# Altium footprint library discret_ic.pcblib: 55 footprints (part 2 of 4)
Each footprint in its own frame and in the unit in brackets; x right, y up, seen from the top. Pads: shape width x height; smd on the part's side, far side on the other; paste and mask are expansions set on the pad; w line width, h text height; cw(c..) or ccw(c..) is an arc to the next point about the centre after c.
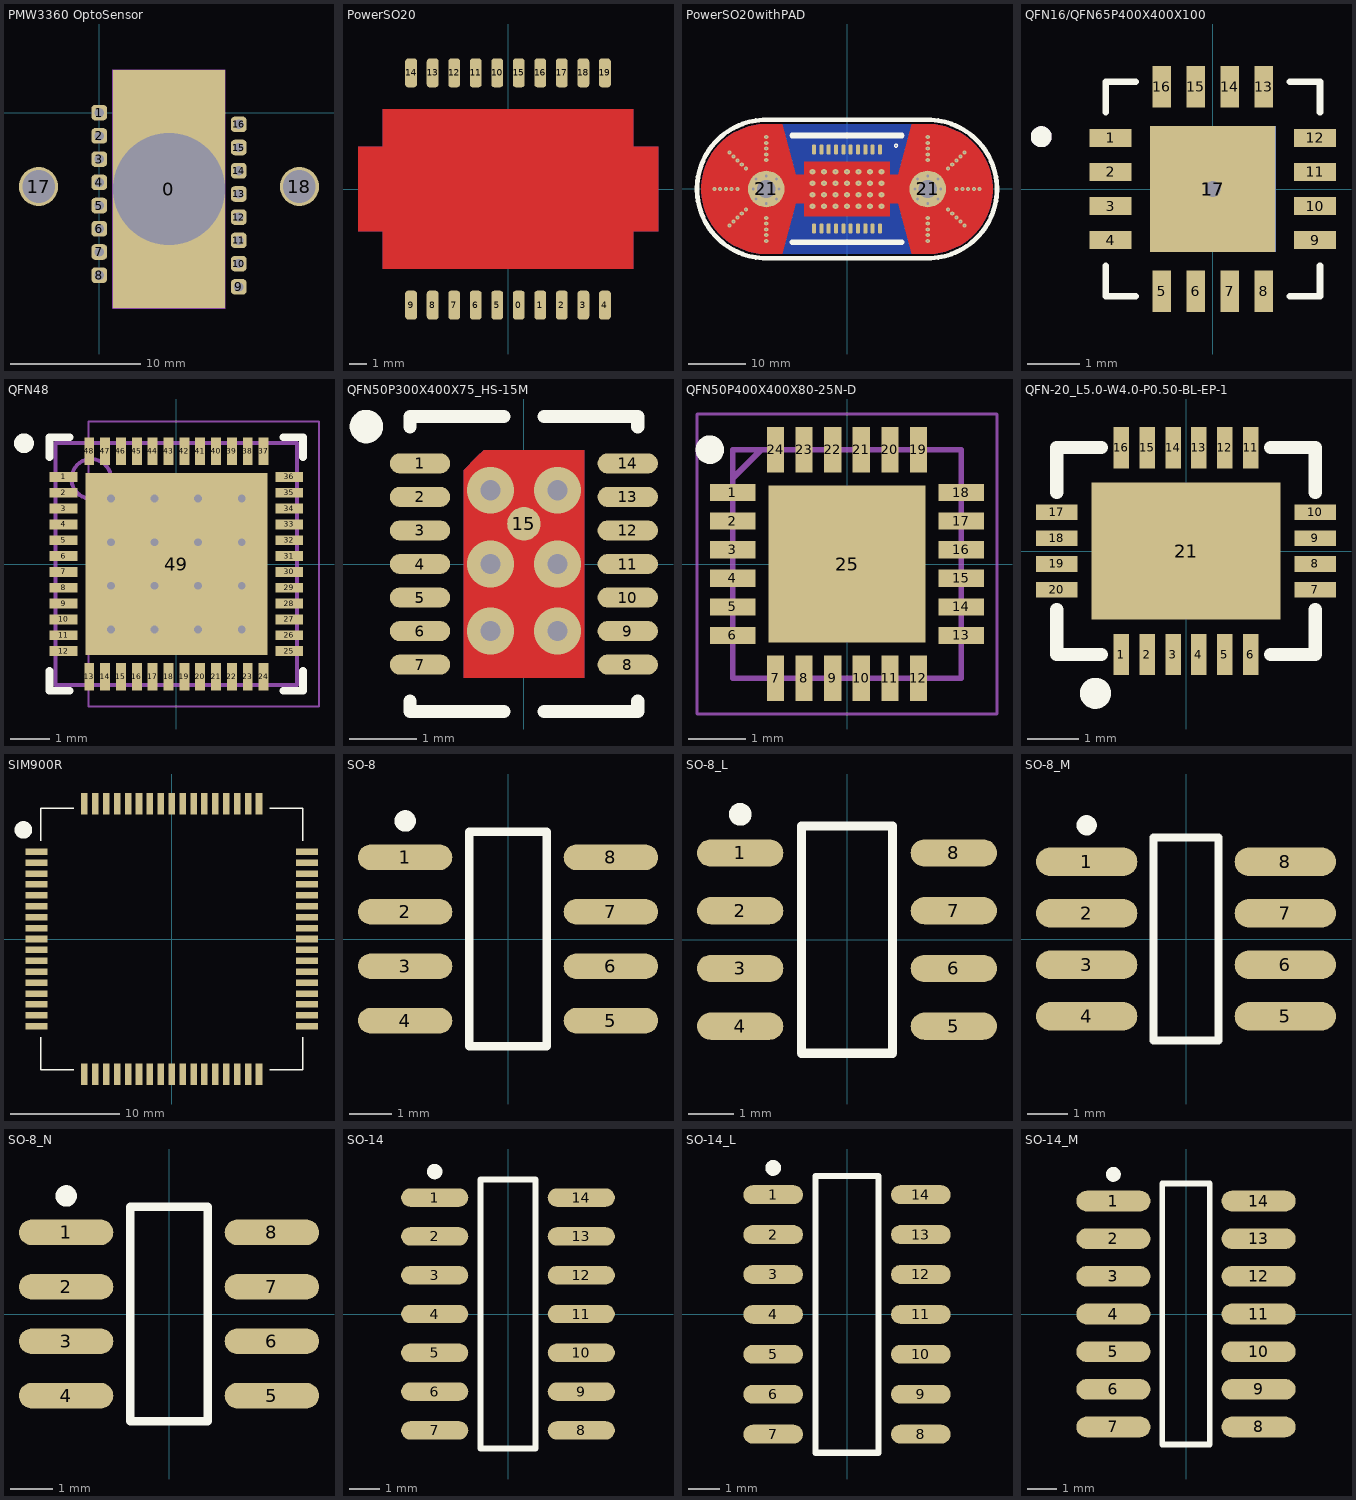
[diagram p1: the footprints below, top view; thin cyan lines are the x and y axes]

## PMW3360 OptoSensor [mm]
pads (19):
  rect 8.6x18.26 hole 8.6 square unplated: 0(5.35,-5.85)
  rrect50% 1.2x1.2 hole 0.7: 1(0,0) 2(0,-1.78) 3(0,-3.56) 4(0,-5.34) 5(0,-7.12) 6(0,-8.9) 7(0,-10.68) 8(0,-12.46) 9(10.7,-13.35) 10(10.7,-11.57) 11(10.7,-9.79) 12(10.7,-8.01) 13(10.7,-6.23) 14(10.7,-4.45) 15(10.7,-2.67) 16(10.7,-0.89)
  round 3 hole 2.5: 17(-4.65,-5.66) 18(15.35,-5.66)
Bottom Overlay:
  lines w0.5: 0.385,2.34 -2.65,2.34 -2.65,-5.66 -2.65,-13.66 0.46,-13.66 ; 10.29,2.34 13.35,2.34 13.35,-5.66 13.35,-13.66 11.91,-13.66
Board:
  lines w0.05: 1.05,-14.98 1.05,0 1.05,3.28 9.65,3.28 9.65,-14.98 1.05,-14.98
Bot3D:
  lines w0.254: 5.425,0 5.5,0.075

## PowerSO20 [mm]
pads (20):
  rrect50% 0.7x1.7 smd: 0(0.635,-6.85) 1(1.905,-6.85) 2(3.175,-6.85) 3(4.445,-6.85) 4(5.715,-6.85) 5(-0.635,-6.85) 6(-1.905,-6.85) 7(-3.175,-6.85) 8(-4.445,-6.85) 9(-5.715,-6.85) 10(-0.635,6.85) 11(-1.905,6.85) 12(-3.175,6.85) 13(-4.445,6.85) 14(-5.715,6.85) 15(0.635,6.85) 16(1.905,6.85) 17(3.175,6.85) 18(4.445,6.85) 19(5.715,6.85)
Top Layer:
  region: -8.85,2.5 -7.4,2.5 -7.4,4.7 7.4,4.7 7.4,2.5 8.85,2.5 8.85,-2.5 7.4,-2.5 7.4,-4.7 -7.4,-4.7 -7.4,-2.5 -8.85,-2.5
Bottom Layer:
  region: -8.85,2.5 -7.4,2.5 -7.4,4.7 7.4,4.7 7.4,2.5 8.85,2.5 8.85,-2.5 7.4,-2.5 7.4,-4.7 -7.4,-4.7 -7.4,-2.5 -8.85,-2.5
3D body "User Library-PowerSO20.STEP": height 3.6, standoff 0, extent -7.985,-7.25 8.015,7.15

## PowerSO20withPAD [mm]
pads (22):
  rrect50% 0.7x1.7 smd: 1(5.715,6.85) 2(4.445,6.85) 3(3.175,6.85) 4(1.905,6.85) 5(0.635,6.85) 6(-0.635,6.85) 7(-1.905,6.85) 8(-3.175,6.85) 9(-4.445,6.85) 10(-5.715,6.85) 11(-5.715,-6.85) 12(-4.445,-6.85) 13(-3.175,-6.85) 14(-1.905,-6.85) 15(-0.635,-6.85) 16(0.635,-6.85) 17(1.905,-6.85) 18(3.175,-6.85) 19(4.445,-6.85) 20(5.715,-6.85)
  round 6.35 hole 3.175: 21(-14,0) 21(14,0)
via -6,-3 diameter 1 hole 0.3
via -6,-1 diameter 1 hole 0.3
via -6,1 diameter 1 hole 0.3
via -4,-3 diameter 1 hole 0.3
via -4,-1 diameter 1 hole 0.3
via -4,1 diameter 1 hole 0.3
via -2,-3 diameter 1 hole 0.3
via -2,-1 diameter 1 hole 0.3
via -2,1 diameter 1 hole 0.3
via 0,1 diameter 1 hole 0.3
via 0,-1 diameter 1 hole 0.3
via 0,-3 diameter 1 hole 0.3
via 2,-3 diameter 1 hole 0.3
via 2,-1 diameter 1 hole 0.3
via 2,1 diameter 1 hole 0.3
via 4,1 diameter 1 hole 0.3
via 4,-1 diameter 1 hole 0.3
via 4,-3 diameter 1 hole 0.3
via 6,-3 diameter 1 hole 0.3
via 6,-1 diameter 1 hole 0.3
via 6,1 diameter 1 hole 0.3
via 6,3 diameter 1 hole 0.3
via 4,3 diameter 1 hole 0.3
via 2,3 diameter 1 hole 0.3
via 0,3 diameter 1 hole 0.3
via -2,3 diameter 1 hole 0.3
via -4,3 diameter 1 hole 0.3
via -6,3 diameter 1 hole 0.3
via -12.25,-1.75 diameter 0.889 hole 0.508
via -15.75,-1.75 diameter 0.889 hole 0.508
via -15.75,1.75 diameter 0.889 hole 0.508
via -12.25,1.75 diameter 0.889 hole 0.508
via -14,-2.5 diameter 0.889 hole 0.508
via -14,2.25 diameter 0.889 hole 0.508
via -11.75,0 diameter 0.889 hole 0.508
via -16.25,0 diameter 0.889 hole 0.508
via 15.75,-1.75 diameter 0.889 hole 0.508
via 12.25,-1.75 diameter 0.889 hole 0.508
via 12.25,1.75 diameter 0.889 hole 0.508
via 15.75,1.75 diameter 0.889 hole 0.508
via 14,-2.5 diameter 0.889 hole 0.508
via 14,2.25 diameter 0.889 hole 0.508
via 16.25,0 diameter 0.889 hole 0.508
via 11.75,0 diameter 0.889 hole 0.508
via -14,-5 diameter 0.7 hole 0.3
via -14,-6 diameter 0.7 hole 0.3
via -14,-7 diameter 0.7 hole 0.3
via -14,-8 diameter 0.7 hole 0.3
via -14,-9 diameter 0.7 hole 0.3
via -14,9 diameter 0.7 hole 0.3
via -14,8 diameter 0.7 hole 0.3
via -14,7 diameter 0.7 hole 0.3
via -14,6 diameter 0.7 hole 0.3
via -14,5 diameter 0.7 hole 0.3
via -20.364,6.364 diameter 0.7 hole 0.3
via -19.657,5.657 diameter 0.7 hole 0.3
via -18.95,4.95 diameter 0.7 hole 0.3
via -18.243,4.243 diameter 0.7 hole 0.3
via -17.536,3.536 diameter 0.7 hole 0.3
via -23,0 diameter 0.7 hole 0.3
via -22,0 diameter 0.7 hole 0.3
via -21,0 diameter 0.7 hole 0.3
via -20,0 diameter 0.7 hole 0.3
via -19,0 diameter 0.7 hole 0.3
via -20.364,-6.364 diameter 0.7 hole 0.3
via -19.657,-5.657 diameter 0.7 hole 0.3
via -18.95,-4.95 diameter 0.7 hole 0.3
via -18.243,-4.243 diameter 0.7 hole 0.3
via -17.536,-3.536 diameter 0.7 hole 0.3
via 14,-9 diameter 0.7 hole 0.3
via 14,-8 diameter 0.7 hole 0.3
via 14,-7 diameter 0.7 hole 0.3
via 14,-6 diameter 0.7 hole 0.3
via 14,-5 diameter 0.7 hole 0.3
via 20.364,-6.364 diameter 0.7 hole 0.3
via 19.657,-5.657 diameter 0.7 hole 0.3
via 18.95,-4.95 diameter 0.7 hole 0.3
via 18.243,-4.243 diameter 0.7 hole 0.3
via 17.536,-3.536 diameter 0.7 hole 0.3
via 23,0 diameter 0.7 hole 0.3
via 22,0 diameter 0.7 hole 0.3
via 21,0 diameter 0.7 hole 0.3
via 20,0 diameter 0.7 hole 0.3
via 19,0 diameter 0.7 hole 0.3
via 20.364,6.364 diameter 0.7 hole 0.3
via 19.657,5.657 diameter 0.7 hole 0.3
via 18.95,4.95 diameter 0.7 hole 0.3
via 18.243,4.243 diameter 0.7 hole 0.3
via 17.536,3.536 diameter 0.7 hole 0.3
via 14,9 diameter 0.7 hole 0.3
via 14,8 diameter 0.7 hole 0.3
via 14,7 diameter 0.7 hole 0.3
via 14,6 diameter 0.7 hole 0.3
via 14,5 diameter 0.7 hole 0.3
Top Layer:
  region: -8.85,2.5 -11.25,11.25 -11.25,-11.25 -8.85,-2.5
  region: -14,-11.25 -14,11.25 -14.442,11.25 -15.323,11.181 -16.196,11.042 -17.056,10.836 -17.897,10.563 -18.714,10.224 -19.501,9.823 -20.255,9.361 -20.97,8.842 -21.642,8.268 -22.268,7.642 -22.842,6.97 -23.361,6.255 -23.823,5.501 -24.224,4.714 -24.563,3.897 -24.836,3.056 -25.042,2.196 -25.181,1.323 -25.25,0.442 -25.25,0 -25.25,-0.442 -25.181,-1.323 -25.042,-2.196 -24.836,-3.056 -24.563,-3.897 -24.224,-4.714 -23.823,-5.501 -23.361,-6.255 -22.842,-6.97 -22.268,-7.642 -21.642,-8.268 -20.97,-8.842 -20.255,-9.361 -19.501,-9.823 -18.714,-10.224 -17.897,-10.563 -17.056,-10.836 -16.196,-11.042 -15.323,-11.181 -14.442,-11.25
  region: -14,11.261 -11.261,11.261 -11.25,11.25 -11.25,-11.25 -14,-11.25
  region: 14,-11.261 11.261,-11.261 11.25,-11.25 11.25,11.25 14,11.25
  region: 14,11.25 14,-11.25 14.442,-11.25 15.323,-11.181 16.196,-11.042 17.056,-10.836 17.897,-10.563 18.714,-10.224 19.501,-9.823 20.255,-9.361 20.97,-8.842 21.642,-8.268 22.268,-7.642 22.842,-6.97 23.361,-6.255 23.823,-5.501 24.224,-4.714 24.563,-3.897 24.836,-3.056 25.042,-2.196 25.181,-1.323 25.25,-0.442 25.25,0 25.25,0.442 25.181,1.323 25.042,2.196 24.836,3.056 24.563,3.897 24.224,4.714 23.823,5.501 23.361,6.255 22.842,6.97 22.268,7.642 21.642,8.267 20.97,8.842 20.255,9.361 19.501,9.823 18.714,10.224 17.897,10.563 17.056,10.836 16.196,11.042 15.323,11.181 14.442,11.25
  region: 8.85,-2.5 11.25,-11.25 11.25,11.25 8.85,2.5
  region: -8.85,2.5 -7.4,2.5 -7.4,4.7 7.4,4.7 7.4,2.5 8.85,2.5 8.85,-2.5 7.4,-2.5 7.4,-4.7 -7.4,-4.7 -7.4,-2.5 -8.85,-2.5
Bottom Layer:
  region: 14,11.25 14,-11.25 14.442,-11.25 15.323,-11.181 16.196,-11.042 17.056,-10.836 17.897,-10.563 18.714,-10.224 19.501,-9.823 20.255,-9.361 20.97,-8.842 21.642,-8.268 22.268,-7.642 22.842,-6.97 23.361,-6.255 23.823,-5.501 24.224,-4.714 24.563,-3.897 24.836,-3.056 25.042,-2.196 25.181,-1.323 25.25,-0.442 25.25,0 25.25,0.442 25.181,1.323 25.042,2.196 24.836,3.056 24.563,3.897 24.224,4.714 23.823,5.501 23.361,6.255 22.842,6.97 22.268,7.642 21.642,8.267 20.97,8.842 20.255,9.361 19.501,9.823 18.714,10.224 17.897,10.563 17.056,10.836 16.196,11.042 15.323,11.181 14.442,11.25
  region: 14,-11.261 11.261,-11.261 11.25,-11.25 11.25,11.25 14,11.25
  region: 8.85,-2.5 11.25,-11.25 11.25,11.25 8.85,2.5
  region: -8.85,2.5 -11.25,11.25 -11.25,-11.25 -8.85,-2.5
  region: -14,11.261 -11.261,11.261 -11.25,11.25 -11.25,-11.25 -14,-11.25
  region: -14,-11.25 -14,11.25 -14.442,11.25 -15.323,11.181 -16.196,11.042 -17.056,10.836 -17.897,10.563 -18.714,10.224 -19.501,9.823 -20.255,9.361 -20.97,8.842 -21.642,8.268 -22.268,7.642 -22.842,6.97 -23.361,6.255 -23.823,5.501 -24.224,4.714 -24.563,3.897 -24.836,3.056 -25.042,2.196 -25.181,1.323 -25.25,0.442 -25.25,0 -25.25,-0.442 -25.181,-1.323 -25.042,-2.196 -24.836,-3.056 -24.563,-3.897 -24.224,-4.714 -23.823,-5.501 -23.361,-6.255 -22.842,-6.97 -22.268,-7.642 -21.642,-8.268 -20.97,-8.842 -20.255,-9.361 -19.501,-9.823 -18.714,-10.224 -17.897,-10.563 -17.056,-10.836 -16.196,-11.042 -15.323,-11.181 -14.442,-11.25
  region: -8.85,2.5 -7.4,2.5 -7.4,4.7 7.4,4.7 7.4,2.5 8.85,2.5 8.85,-2.5 7.4,-2.5 7.4,-4.7 -7.4,-4.7 -7.4,-2.5 -8.85,-2.5
  region: -11.25,11.25 11.25,11.25 11.25,-11.25 -11.25,-11.25
Top Overlay:
  circle w0.254: c8.5,7.5 r0.254
  lines w0.8: -14,-12 cw(c-14,0) -14,12 14,12 cw(c14,0) 14,-12 -14,-12
  lines w1: -9.5,-9.25 9.5,-9.25 ; -9.5,9.25 9.5,9.25
Top Solder:
  drawing of 11 lines, arcs and shapes, not listed
Bottom Solder:
  region: -8.85,2.5 -7.4,2.5 -7.4,4.7 7.4,4.7 7.4,2.5 8.85,2.5 8.85,-2.5 7.4,-2.5 7.4,-4.7 -7.4,-4.7 -7.4,-2.5 -8.85,-2.5
3D body "User Library-PowerSO20.STEP": height 3.6, standoff 0, extent -7.985,-7.25 8.015,7.15

## QFN16/QFN65P400X400X100 [mm] "QFN, 14-Leads, Body 3,00x4,00mm, Pitch 0,50mm, Thermal Pad 1,00x1,50mm, IPC Low Density"
height 0.75
pads (18):
  rect 0.8x0.35 smd: 1(-1.955,0.975) 2(-1.955,0.325) 3(-1.955,-0.325) 4(-1.955,-0.975) 9(1.955,-0.975) 10(1.955,-0.325) 11(1.955,0.325) 12(1.955,0.975)
  rect 0.35x0.8 smd: 5(-0.975,-1.955) 6(-0.325,-1.955) 7(0.325,-1.955) 8(0.975,-1.955) 13(0.975,1.955) 14(0.325,1.955) 15(-0.325,1.955) 16(-0.975,1.955)
  rect 2.4x2.4 smd: 17(0,0)
  rect 2.4x2.4 smd far side: 17(0,0)
via 0,0 diameter 0.7 hole 0.3
Top Overlay:
  circle w0.2: c-3.28,1 r0.1
  lines w0.127: -2.05,-1.47 -2.05,-2.05 -1.47,-2.05 ; -2.05,1.47 -2.05,2.05 -1.47,2.05 ; 1.47,-2.05 2.05,-2.05 2.05,-1.47 ; 1.47,2.05 2.05,2.05 2.05,1.47
Top Paste:
  region: 0.115,-0.115 0.965,-0.115 0.965,-0.965 0.115,-0.965
  region: -0.965,-0.115 -0.115,-0.115 -0.115,-0.965 -0.965,-0.965
  region: 0.115,0.965 0.965,0.965 0.965,0.115 0.115,0.115
  region: -0.965,0.965 -0.115,0.965 -0.115,0.115 -0.965,0.115
BotAssy:
  circle w0.2: c-3.28,1 r0.1
  circle w0.2: c-3.28,1 r0.1
3D body "ALSRobot-QFN16 4x4.step": height 0.92, standoff 0, extent -2,-2 2,2

## QFN48 [mm] "QFN, 48-Leads, Body 6,00x6,00mm, Pitch 0,40mm, Thermal Pad 4,50x4,50mm, IPC Medium Density"
height 0.75
pads (49):
  rect 0.7x0.25 smd mask+0.05: 1(-2.85,2.2) 2(-2.85,1.8) 3(-2.85,1.4) 4(-2.85,1) 5(-2.85,0.6) 6(-2.85,0.2) 7(-2.85,-0.2) 8(-2.85,-0.6) 9(-2.85,-1) 10(-2.85,-1.4) 11(-2.85,-1.8) 12(-2.85,-2.2) 25(2.85,-2.2) 26(2.85,-1.8) 27(2.85,-1.4) 28(2.85,-1) 29(2.85,-0.6) 30(2.85,-0.2) 31(2.85,0.2) 32(2.85,0.6) 33(2.85,1) 34(2.85,1.4) 35(2.85,1.8) 36(2.85,2.2)
  rect 0.25x0.7 smd mask+0.05: 13(-2.2,-2.85) 14(-1.8,-2.85) 15(-1.4,-2.85) 16(-1,-2.85) 17(-0.6,-2.85) 18(-0.2,-2.85) 19(0.2,-2.85) 20(0.6,-2.85) 21(1,-2.85) 22(1.4,-2.85) 23(1.8,-2.85) 24(2.2,-2.85) 37(2.2,2.85) 38(1.8,2.85) 39(1.4,2.85) 40(1,2.85) 41(0.6,2.85) 42(0.2,2.85) 43(-0.2,2.85) 44(-0.6,2.85) 45(-1,2.85) 46(-1.4,2.85) 47(-1.8,2.85) 48(-2.2,2.85)
  rect 4.6x4.6 smd mask+0.05: 49(0,0)
via 1.65,-1.65 diameter 0.5 hole 0.2
via 0.55,-1.65 diameter 0.5 hole 0.2
via -0.55,-1.65 diameter 0.5 hole 0.2
via -1.65,-1.65 diameter 0.5 hole 0.2
via 1.65,-0.55 diameter 0.5 hole 0.2
via 0.55,-0.55 diameter 0.5 hole 0.2
via -0.55,-0.55 diameter 0.5 hole 0.2
via -1.65,-0.55 diameter 0.5 hole 0.2
via 1.65,0.55 diameter 0.5 hole 0.2
via 0.55,0.55 diameter 0.5 hole 0.2
via -0.55,0.55 diameter 0.5 hole 0.2
via -1.65,0.55 diameter 0.5 hole 0.2
via 1.65,1.65 diameter 0.5 hole 0.2
via 0.55,1.65 diameter 0.5 hole 0.2
via -0.55,1.65 diameter 0.5 hole 0.2
via -1.65,1.65 diameter 0.5 hole 0.2
Top Overlay:
  circle w0.25: c-3.85,3.05 r0.125
  lines w0.2: -3.2,-2.7 -3.2,-3.2 -2.7,-3.2 ; -3.2,2.7 -3.2,3.2 -2.7,3.2 ; 2.7,-3.2 3.2,-3.2 3.2,-2.7 ; 2.7,3.2 3.2,3.2 3.2,2.7
Plata3D:
  circle w0.1: c-2.15,2.15 r0.5
  lines w0.1: -3.05,-3.05 3.05,-3.05 3.05,3.05 -3.05,3.05 -3.05,-3.05
Board3D:
  lines w0.05: -2.225,-3.6 3.6,-3.6 3.6,3.6 -2.225,3.6 -2.225,-3.6
  lines w0.1: -0.5,0 0.5,0 ; 0,-0.5 0,0.5
3D body: height 0.75, standoff 0, extent -3.05,-3.05 3.05,3.05

## QFN50P300X400X75_HS-15M [mm] "QFN, 14-Leads, Body 3,00x4,00mm, Pitch 0,50mm, Thermal Pad 1,00x1,50mm, IPC Low Density"
height 0.75
pads (15):
  oval 0.9x0.3 smd: 1(-1.55,1.5) 2(-1.55,1) 3(-1.55,0.5) 4(-1.55,0) 5(-1.55,-0.5) 6(-1.55,-1) 7(-1.55,-1.5) 8(1.55,-1.5) 9(1.55,-1) 10(1.55,-0.5) 11(1.55,0) 12(1.55,0.5) 13(1.55,1) 14(1.55,1.5)
  round 0.5 smd: 15(0,0.6)
via 0.5,-1 diameter 0.7 hole 0.3
via -0.5,-1 diameter 0.7 hole 0.3
via 0.5,0 diameter 0.7 hole 0.3
via -0.5,0 diameter 0.7 hole 0.3
via 0.5,1.1 diameter 0.7 hole 0.3
via -0.5,1.1 diameter 0.7 hole 0.3
Top Layer:
  region: -0.9,-1.7 -0.9,1.4 -0.7,1.6 -0.6,1.7 0.9,1.7 0.9,-1.7
Bottom Layer:
  region: -0.9,-1.7 -0.9,1.4 -0.7,1.6 -0.6,1.7 0.9,1.7 0.9,-1.7
Top Overlay:
  circle w0.25: c-2.35,2.05 r0.125
  lines w0.2: -1.7,-2.05 -1.7,-2.2 -0.3,-2.2 ; -1.7,2.05 -1.7,2.2 -0.3,2.2 ; 0.3,-2.2 1.7,-2.2 1.7,-2.05 ; 0.3,2.2 1.7,2.2 1.7,2.05
Top Solder:
  region: -0.9,-1.7 -0.9,1.4 -0.7,1.6 -0.6,1.7 0.9,1.7 0.9,-1.7
3D body "User Library-LT3479EDE#PBF-2.step": height 0.75, standoff 0, extent -1.5,-2 1.5,2

## QFN50P400X400X80-25N-D [mm]
height 1.35
pads (25):
  rect 0.8x0.3 smd: 1(-2,1.25) 2(-2,0.75) 3(-2,0.25) 4(-2,-0.25) 5(-2,-0.75) 6(-2,-1.25) 13(2,-1.25) 14(2,-0.75) 15(2,-0.25) 16(2,0.25) 17(2,0.75) 18(2,1.25)
  rect 0.3x0.8 smd: 7(-1.25,-2) 8(-0.75,-2) 9(-0.25,-2) 10(0.25,-2) 11(0.75,-2) 12(1.25,-2) 19(1.25,2) 20(0.75,2) 21(0.25,2) 22(-0.25,2) 23(-0.75,2) 24(-1.25,2)
  rect 2.75x2.75 smd: 25(0,0)
Top Overlay:
  circle w0.25: c-2.4,2 r0.125
Plata3D:
  lines w0.1: -2,1.5 -1.5,2 ; -2,-2 -2,2 2,2 2,-2 -2,-2
Board3D:
  lines w0.05: -2.625,-2.625 -2.625,2.625 2.625,2.625 2.625,-2.625 -2.625,-2.625
3D body "AW9523BTQR.stp": height 0.8, standoff 0, extent -2.05,-2.05 2.05,2.05

## QFN-20_L5.0-W4.0-P0.50-BL-EP-1 [mm]
pads (21):
  rect 0.3x0.8 smd paste-100 mask+0.051: 1(-1.25,-2) 2(-0.75,-2) 3(-0.25,-2) 4(0.25,-2) 5(0.75,-2) 6(1.25,-2) 11(1.25,2) 12(0.75,2) 13(0.25,2) 14(-0.25,2) 15(-0.75,2) 16(-1.25,2)
  rect 0.8x0.3 smd paste-100 mask+0.051: 7(2.5,-0.75) 8(2.5,-0.25) 9(2.5,0.25) 10(2.5,0.75) 17(-2.5,0.75) 18(-2.5,0.25) 19(-2.5,-0.25) 20(-2.5,-0.75)
  rect 3.65x2.65 smd paste-100 mask+0.051: 21(0,0)
Top Overlay:
  circle w0.3: c-1.75,-2.75 r0.15
  lines w0.254: -2.5,-1.131 -2.5,-2 -1.631,-2 ; -2.5,1.131 -2.5,2 -1.631,2 ; 1.631,-2 2.5,-2 2.5,-1.131 ; 1.631,2 2.5,2 2.5,1.131
Top Paste:
  region: -1.46,1.06 1.46,1.06 1.46,-1.06 -1.46,-1.06
  region: 1.4,1.6 1.4,2.4 1.1,2.4 1.1,1.6
  region: 0.6,2.4 0.6,1.6 0.9,1.6 0.9,2.4
  region: 0.1,2.4 0.1,1.6 0.4,1.6 0.4,2.4
  region: -0.4,2.4 -0.4,1.6 -0.1,1.6 -0.1,2.4
  region: -0.9,2.4 -0.9,1.6 -0.6,1.6 -0.6,2.4
  region: -1.1,1.6 -1.1,2.4 -1.4,2.4 -1.4,1.6
  region: 2.9,0.6 2.9,0.9 2.1,0.9 2.1,0.6
  region: -2.1,0.6 -2.1,0.9 -2.9,0.9 -2.9,0.6
  region: -2.1,0.1 -2.1,0.4 -2.9,0.4 -2.9,0.1
  region: 2.9,0.1 2.9,0.4 2.1,0.4 2.1,0.1
  region: 2.9,-0.4 2.9,-0.1 2.1,-0.1 2.1,-0.4
  region: -2.9,-0.1 -2.9,-0.4 -2.1,-0.4 -2.1,-0.1
  region: -2.9,-0.6 -2.9,-0.9 -2.1,-0.9 -2.1,-0.6
  region: 2.9,-0.9 2.9,-0.6 2.1,-0.6 2.1,-0.9
  region: 1.1,-1.6 1.1,-2.4 1.4,-2.4 1.4,-1.6
  region: -1.1,-2.4 -1.1,-1.6 -1.4,-1.6 -1.4,-2.4
  region: 0.6,-1.6 0.6,-2.4 0.9,-2.4 0.9,-1.6
  region: 0.1,-1.6 0.1,-2.4 0.4,-2.4 0.4,-1.6
  region: -0.4,-1.6 -0.4,-2.4 -0.1,-2.4 -0.1,-1.6
  region: -0.6,-2.4 -0.6,-1.6 -0.9,-1.6 -0.9,-2.4
3D body "User Library-QFN24_4x5x075.STEP": height 0.75, standoff -0.01, extent -2.51,-2.01 2.51,2.01

## SIM900R [mm]
height 5
pads (68):
  rect 2x0.6 smd paste-25.4 mask-25.4: 1(-12.4,8) 2(-12.4,7) 3(-12.4,6) 4(-12.4,5) 5(-12.4,4) 6(-12.4,3) 7(-12.4,2) 8(-12.4,1) 9(-12.4,0) 10(-12.4,-1) 11(-12.4,-2) 12(-12.4,-3) 13(-12.4,-4) 14(-12.4,-5) 15(-12.4,-6) 16(-12.4,-7) 17(-12.4,-8) 35(12.4,-8) 36(12.4,-7) 37(12.4,-6) 38(12.4,-5) 39(12.4,-4) 40(12.4,-3) 41(12.4,-2) 42(12.4,-1) 43(12.4,0) 44(12.4,1) 45(12.4,2) 46(12.4,3) 47(12.4,4) 48(12.4,5) 49(12.4,6) 50(12.4,7) 51(12.4,8)
  rect 0.6x2 smd paste-25.4 mask-25.4: 18(-8,-12.4) 19(-7,-12.4) 20(-6,-12.4) 21(-5,-12.4) 22(-4,-12.4) 23(-3,-12.4) 24(-2,-12.4) 25(-1,-12.4) 26(0,-12.4) 27(1,-12.4) 28(2,-12.4) 29(3,-12.4) 30(4,-12.4) 31(5,-12.4) 32(6,-12.4) 33(7,-12.4) 34(8,-12.4) 52(8,12.4) 53(7,12.4) 54(6,12.4) 55(5,12.4) 56(4,12.4) 57(3,12.4) 58(2,12.4) 59(1,12.4) 60(0,12.4) 61(-1,12.4) 62(-2,12.4) 63(-3,12.4) 64(-4,12.4) 65(-5,12.4) 66(-6,12.4) 67(-7,12.4) 68(-8,12.4)
Top Overlay:
  circle w0.813: c-13.6,10 r0.4
  lines w0.127: -12,-9 -12,-12 -9,-12 ; -12,9 -12,12 -9,12 ; 9,-12 12,-12 12,-9 ; 9,12 12,12 12,9
Top Paste:
  drawing of 68 lines, arcs and shapes, not listed
Top Solder:
  drawing of 68 lines, arcs and shapes, not listed
3D body "User Library-SIM900.STEP": height 3.02, standoff 0, extent -12,-12 12,12

## SO-8 [mm] "SOIC, 8-Leads, Body 4.9x3.9mm, Pitch 1.27mm, IPC Medium Density"
height 1.75
pads (8):
  oval 2.2x0.6 smd: 1(-2.4,1.905) 2(-2.4,0.635) 3(-2.4,-0.635) 4(-2.4,-1.905) 5(2.4,-1.905) 6(2.4,-0.635) 7(2.4,0.635) 8(2.4,1.905)
Top Overlay:
  circle w0.25: c-2.4,2.755 r0.125
  lines w0.2: -0.9,-2.5 -0.9,2.5 0.9,2.5 0.9,-2.5 -0.9,-2.5
3D body "so-8.step": height 1.88, standoff -0.03, extent -3.169,-2.515 3.169,2.489

## SO-8_L [mm] "SOIC, 8-Leads, Body 4.9x3.9mm, Pitch 1.27mm, IPC High Density"
height 1.75
pads (8):
  oval 1.9x0.6 smd: 1(-2.35,1.905) 2(-2.35,0.635) 3(-2.35,-0.635) 4(-2.35,-1.905) 5(2.35,-1.905) 6(2.35,-0.635) 7(2.35,0.635) 8(2.35,1.905)
Top Overlay:
  circle w0.25: c-2.35,2.755 r0.125
  lines w0.2: -1,-2.5 -1,2.5 1,2.5 1,-2.5 -1,-2.5
3D body "so-8.step": height 1.88, standoff -0.03, extent -3.169,-2.515 3.169,2.489

## SO-8_M [mm] "SOIC, 8-Leads, Body 4.9x3.9mm, Pitch 1.27mm, IPC Low Density"
height 1.75
pads (8):
  oval 2.5x0.7 smd: 1(-2.45,1.905) 2(-2.45,0.635) 3(-2.45,-0.635) 4(-2.45,-1.905) 5(2.45,-1.905) 6(2.45,-0.635) 7(2.45,0.635) 8(2.45,1.905)
Top Overlay:
  circle w0.25: c-2.45,2.805 r0.125
  lines w0.2: -0.8,-2.5 0.8,-2.5 0.8,2.5 -0.8,2.5 -0.8,-2.5
3D body "so-8.step": height 1.88, standoff -0.03, extent -3.169,-2.515 3.169,2.489

## SO-8_N [mm] "SOIC, 8-Leads, Body 4.9x3.9mm, Pitch 1.27mm, IPC Medium Density"
height 1.75
pads (8):
  oval 2.2x0.6 smd: 1(-2.4,1.905) 2(-2.4,0.635) 3(-2.4,-0.635) 4(-2.4,-1.905) 5(2.4,-1.905) 6(2.4,-0.635) 7(2.4,0.635) 8(2.4,1.905)
Top Overlay:
  circle w0.25: c-2.4,2.755 r0.125
  lines w0.2: -0.9,-2.5 -0.9,2.5 0.9,2.5 0.9,-2.5 -0.9,-2.5
3D body "so-8.step": height 1.88, standoff -0.03, extent -3.169,-2.515 3.169,2.489

## SO-14 [mm] "14-Pin Small Outline Integrated Circuit 1.27 mm Pitch, IPC Medium Density"
height 1.75
pads (14):
  oval 2.2x0.6 smd: 1(-2.4,3.81) 2(-2.4,2.54) 3(-2.4,1.27) 4(-2.4,0) 5(-2.4,-1.27) 6(-2.4,-2.54) 7(-2.4,-3.81) 8(2.4,-3.81) 9(2.4,-2.54) 10(2.4,-1.27) 11(2.4,0) 12(2.4,1.27) 13(2.4,2.54) 14(2.4,3.81)
Top Overlay:
  circle w0.25: c-2.4,4.66 r0.125
  lines w0.2: -0.9,-4.4 0.9,-4.4 0.9,4.4 -0.9,4.4 -0.9,-4.4
3D body "CircuitWorks-SO-14 (PIC16F684).step": height 1.58, standoff -0.02, extent -2.995,-4.345 2.995,4.345

## SO-14_L [mm] "14-Pin Small Outline Integrated Circuit 1.27 mm Pitch, IPC High Density"
height 1.75
pads (14):
  oval 1.9x0.6 smd: 1(-2.35,3.81) 2(-2.35,2.54) 3(-2.35,1.27) 4(-2.35,0) 5(-2.35,-1.27) 6(-2.35,-2.54) 7(-2.35,-3.81) 8(2.35,-3.81) 9(2.35,-2.54) 10(2.35,-1.27) 11(2.35,0) 12(2.35,1.27) 13(2.35,2.54) 14(2.35,3.81)
Top Overlay:
  circle w0.25: c-2.35,4.66 r0.125
  lines w0.2: -1,-4.4 1,-4.4 1,4.4 -1,4.4 -1,-4.4
3D body "CircuitWorks-SO-14 (PIC16F684).step": height 1.58, standoff -0.02, extent -2.995,-4.345 2.995,4.345

## SO-14_M [mm] "14-Pin Small Outline Integrated Circuit 1.27 mm Pitch, IPC Low Density"
height 1.75
pads (14):
  oval 2.5x0.7 smd: 1(-2.45,3.81) 2(-2.45,2.54) 3(-2.45,1.27) 4(-2.45,0) 5(-2.45,-1.27) 6(-2.45,-2.54) 7(-2.45,-3.81) 8(2.45,-3.81) 9(2.45,-2.54) 10(2.45,-1.27) 11(2.45,0) 12(2.45,1.27) 13(2.45,2.54) 14(2.45,3.81)
Top Overlay:
  circle w0.25: c-2.45,4.71 r0.125
  lines w0.2: -0.8,-4.4 -0.8,4.4 0.8,4.4 0.8,-4.4 -0.8,-4.4
3D body "CircuitWorks-SO-14 (PIC16F684).step": height 1.58, standoff -0.02, extent -2.995,-4.345 2.995,4.345